# Altium footprint library CPD.PcbLib: 58 footprints (part 3 of 4)
Each footprint in its own frame and in the unit in brackets; x right, y up, seen from the top. Pads: shape width x height; smd on the part's side, far side on the other; paste and mask are expansions set on the pad; w line width, h text height; cw(c..) or ccw(c..) is an arc to the next point about the centre after c.
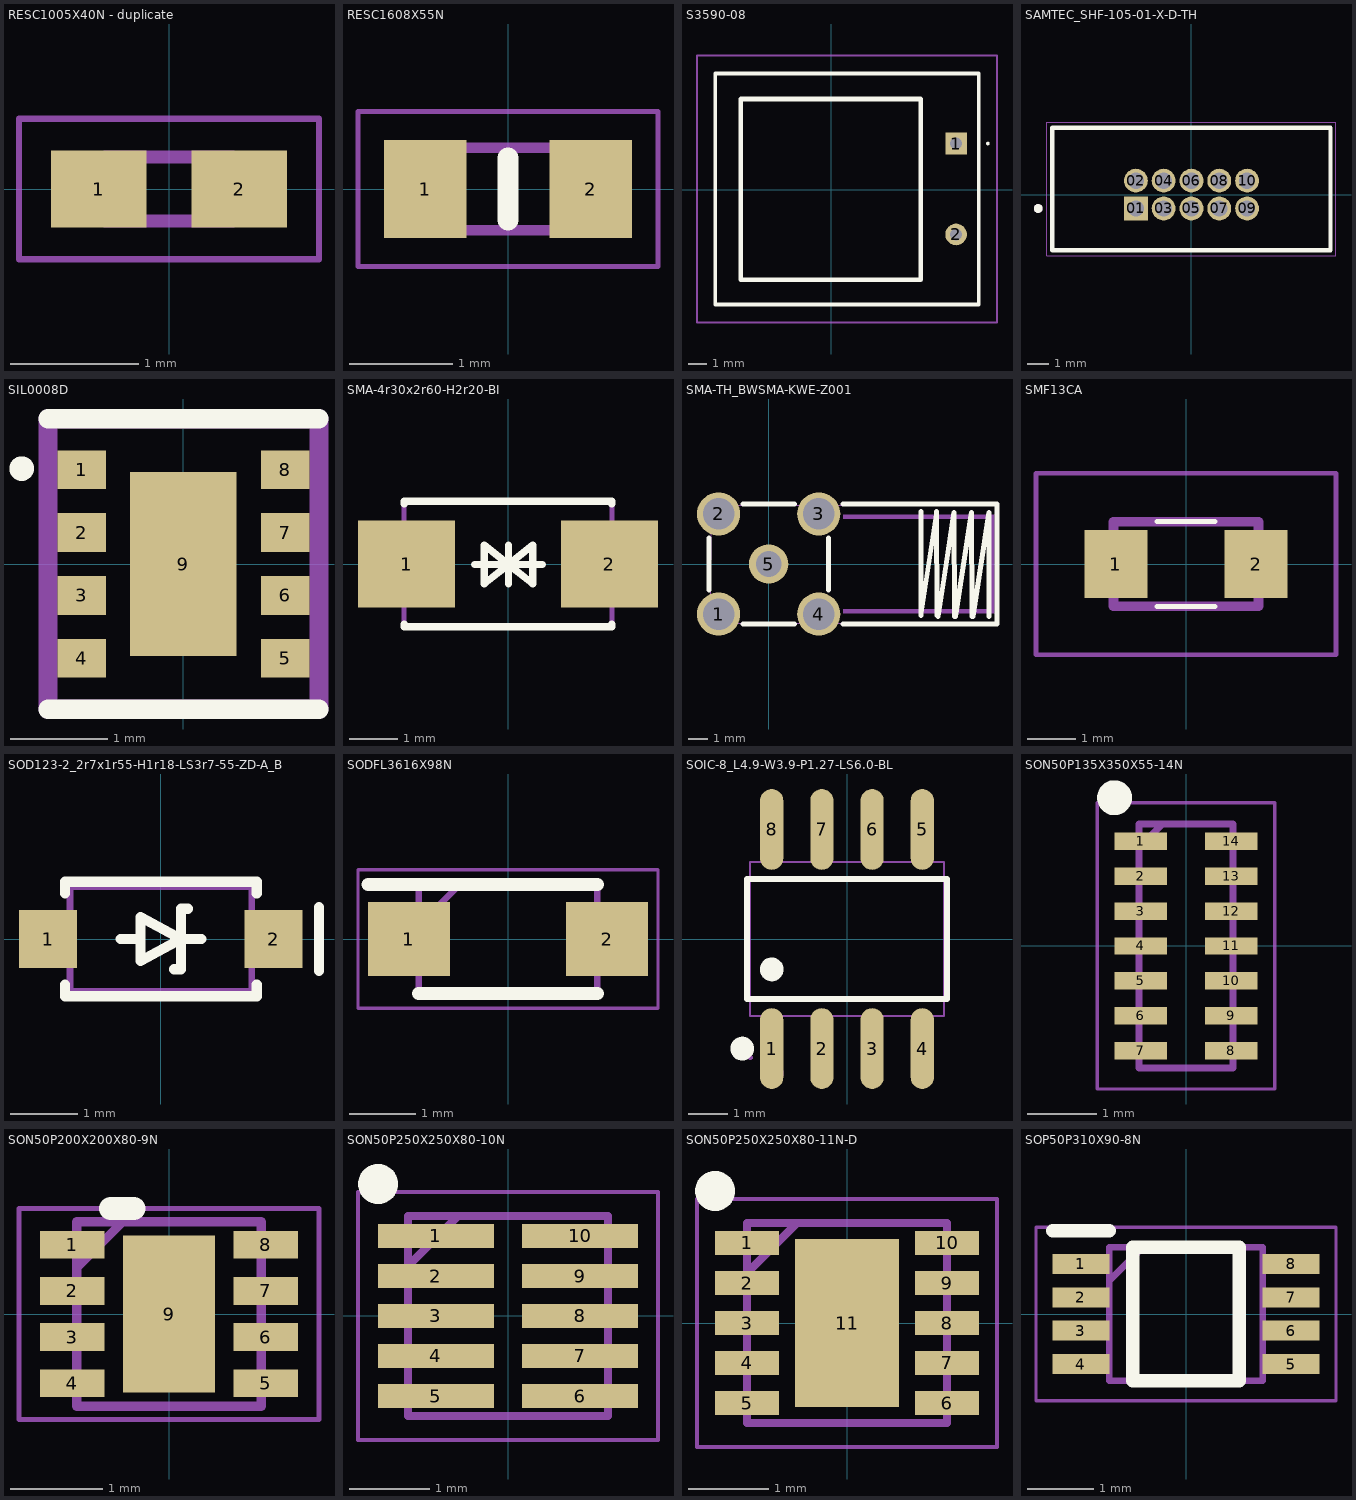
[diagram p2: the footprints below, top view; thin cyan lines are the x and y axes]

## RESC1005X40N - duplicate [mm]
pads (2):
  rect 0.75x0.6 smd: 1(-0.55,0) 2(0.55,0)
Mechanical 13:
  lines w0.1: -0.5,-0.25 -0.5,0.25 0.5,0.25 0.5,-0.25 -0.5,-0.25
Mechanical 15:
  lines w0.05: -1.175,-0.55 -1.175,0.55 1.175,0.55 1.175,-0.55 -1.175,-0.55
3D body "RC0402FR-070RL.stp": height 0.4, standoff 0, extent -0.5,-0.25 0.5,0.25

## RESC1608X55N [mm]
pads (2):
  rect 0.8x0.95 smd: 1(-0.8,0) 2(0.8,0)
Top Overlay:
  lines w0.2: 0,-0.3 0,0.3
Mechanical 13:
  lines w0.1: -0.8,-0.4 0.8,-0.4 0.8,0.4 -0.8,0.4 -0.8,-0.4
Mechanical 15:
  lines w0.05: -1.45,-0.75 1.45,-0.75 1.45,0.75 -1.45,0.75 -1.45,-0.75
3D body "RT0603BRD07523KL.stp": height 0.55, standoff 0, extent -0.8,-0.4 0.8,0.4

## S3590-08 [mm]
pads (2):
  rect 1.192x1.192 hole 0.65: 1(6.858,2.54)
  round 1.192 hole 0.65: 2(6.858,-2.46)
Top Overlay:
  lines w0.1: 8.558,2.54 cw(c8.608,2.54) 8.658,2.54 cw(c8.608,2.54) 8.558,2.54
  lines w0.2: -6.392,-6.31 8.108,-6.31 8.108,6.39 -6.392,6.39 -6.392,-6.31
  lines w0.254: -4.992,-4.96 4.908,-4.96 ; -4.992,-4.91 -4.992,4.99 4.908,4.99 4.908,-4.91
Mechanical 13:
  lines w0.1: -6.392,-6.31 8.108,-6.31 8.108,6.39 -6.392,6.39 -6.392,-6.31
Mechanical 15:
  lines w0.1: -7.392,-7.31 9.108,-7.31 9.108,7.39 -7.392,7.39 -7.392,-7.31
3D body "S3590-08.stp": height 2.08, standoff -5, extent -6.392,-6.31 8.108,6.39

## SAMTEC_SHF-105-01-X-D-TH [mm]
height 5.33
pads (10):
  rect 1.09x1.09 / inner round 1.09 / far side rect 1.09x1.09 hole 0.74: 01(-2.54,-0.635)
  round 1.09 hole 0.74: 02(-2.54,0.635) 03(-1.27,-0.635) 04(-1.27,0.635) 05(0,-0.635) 06(0,0.635) 07(1.27,-0.635) 08(1.27,0.635) 09(2.54,-0.635) 10(2.54,0.635)
Top Overlay:
  circle w0.2: c-7,-0.635 r0.1
  lines w0.2: -6.35,-2.54 -6.35,3.05 6.35,3.05 6.35,-2.54 -6.35,-2.54
Mechanical 13:
  circle w0.2: c-7,-0.635 r0.1
  lines w0.1: -6.35,-2.54 6.35,-2.54 6.35,3.05 -6.35,3.05 -6.35,-2.54
Mechanical 15:
  lines w0.05: -6.6,-2.79 -6.6,3.3 6.6,3.3 6.6,-2.79 -6.6,-2.79
3D body "SHF-105-01-L-D-TH-TR.stp": height 5.36, standoff -1.88, extent -6.35,-2.54 6.35,3.048

## SIL0008D [mm]
pads (9):
  rect 0.5x0.4 smd: 1(-1.05,0.975) 2(-1.05,0.325) 3(-1.05,-0.325) 4(-1.05,-0.975) 5(1.05,-0.975) 6(1.05,-0.325) 7(1.05,0.325) 8(1.05,0.975)
  rect 1.1x1.9 smd: 9(0,0)
Top Overlay:
  circle w0.2: c-1.672,0.986 r0.027
  lines w0.2: -1.4,-1.5 1.4,-1.5 ; -1.4,1.5 1.4,1.5
Mechanical 13:
  lines w0.2: -1.4,-1.5 -1.4,1.5 1.4,1.5 1.4,-1.5 -1.4,-1.5
3D body "TPS82130SILR.stp": height 1.31, standoff 0, extent -1.4,-1.5 1.4,1.5

## SMA-4r30x2r60-H2r20-BI [mm]
height 2.2
pads (2):
  rect 2.007x1.803 smd paste+0 mask+0.076: 1(-2.1,0) 2(2.1,0)
Top Overlay:
  lines w0.152: -2.15,-1.25 -2.15,-1.3 2.15,-1.3 2.15,-1.25 ; -2.15,1.25 -2.15,1.3 2.15,1.3 2.15,1.25 ; -0.69,-0.01 0.71,-0.01 ; 0.01,-0.41 0.01,0.39 ; 0.01,-0.01 -0.49,0.39 -0.49,-0.41 0.01,-0.01 ; 0.01,-0.01 0.51,0.39 0.51,-0.41 0.01,-0.01
Mechanical 13:
  lines w0.1: -0.69,-0.01 0.71,-0.01 ; 0.01,-0.41 0.01,0.39 ; 0.01,-0.01 -0.49,0.39 -0.49,-0.41 0.01,-0.01 ; 0.01,-0.01 0.51,0.39 0.51,-0.41 0.01,-0.01 ; -2.15,-1.3 -2.15,1.3 2.15,1.3 2.15,-1.3 -2.15,-1.3
  text "SMA-4r30x2r60-H2r20-BI" at -5.377,-2.65 h1
3D body "SMA-4r30x2r60-H2r20-BI.step": height 2.19, standoff 0, extent -2.6,-1.27 2.6,1.33

## SMA-TH_BWSMA-KWE-Z001 [mm]
pads (5):
  round 2.2 hole 1.6 paste+0.051: 1(-2.55,-2.55) 2(-2.55,2.55) 3(2.55,2.55)
  round 2.2 hole 1.6 copper offset 0,0 paste+0.051: 4(2.55,-2.55)
  round 2 hole 1.3 paste+0.051: 5(0,0)
Top Overlay:
  lines w0.254: -3.048,-1.316 -3.048,1.316 ; -1.316,-3.048 1.316,-3.048 ; -1.316,3.048 1.316,3.048 ; 3.048,-1.316 3.048,1.316 ; 3.784,-3.048 11.63,-3.048 ; 3.784,3.048 11.6,3.048 ; 7.747,2.667 7.747,-2.633 8.56,2.667 8.566,-2.633 ; 8.636,-2.667 9.449,2.633 9.455,-2.667 ; 9.525,-2.667 10.338,2.633 10.344,-2.667 ; 10.414,-2.667 11.227,2.633 11.233,-2.667 ; 11.63,-3 11.63,-2.62 11.63,2.68 11.63,3.048
Mechanical 2:
  region: 11.5,2.3 11.5,-2.3 11.3,-2.3 11.3,2.3
  region: 3.8,-2.5 11.5,-2.5 11.5,-2.3 3.8,-2.3
  region: 3.8,2.5 11.5,2.5 11.5,2.3 3.8,2.3
Mechanical 6:
  lines w0.051: -2.941,-3.017 -2.941,-2.538 -2.932,2.996 11.591,2.996 11.591,-3.017 -2.941,-3.017
Mechanical 8:
  region: -2.94,-3.017 -2.94,-3.042 -2.975,-3.077 -3.025,-3.077 -3.06,-3.042 -3.06,-3.017 -3.06,-2.992 -3.025,-2.957 -2.975,-2.957 -2.94,-2.992
Mechanical 9:
  region: 2.1,3 3,3 3,2.1 2.1,2.1
  region: 2.1,-2.1 3,-2.1 3,-3 2.1,-3
  region: -3,-2.1 -2.1,-2.1 -2.1,-3 -3,-3
  region: -3,3 -2.1,3 -2.1,2.1 -3,2.1
  region: 0.45,0 0.45,-0.089 0.381,-0.255 0.255,-0.381 0.089,-0.45 -0.09,-0.45 -0.255,-0.381 -0.382,-0.255 -0.45,-0.089 -0.45,0 -0.45,0.09 -0.382,0.255 -0.255,0.382 -0.09,0.45 0.089,0.45 0.255,0.382 0.381,0.255 0.45,0.09

## SMF13CA [mm]
pads (2):
  rect 1.3x1.4 smd: 1(-1.45,0) 2(1.45,0)
Top Overlay:
  lines w0.1: -0.6,-0.875 0.6,-0.875 ; -0.6,0.875 0.6,0.875
Mechanical 13:
  lines w0.2: -1.5,-0.875 1.5,-0.875 1.5,0.875 -1.5,0.875 -1.5,-0.875
Mechanical 15:
  lines w0.1: -3.1,-1.875 3.1,-1.875 3.1,1.875 -3.1,1.875 -3.1,-1.875
3D body "SMF13CA.stp": height 1.18, standoff 0, extent -1.97,-0.875 1.97,0.875

## SOD123-2_2r7x1r55-H1r18-LS3r7-55-ZD-A_B [mm]
height 1.35
pads (2):
  rect 0.864x0.864 smd paste+0 mask+0.076: 1(-1.675,0) 2(1.675,0)
Top Overlay:
  lines w0.152: -1.425,-0.851 -1.425,-0.675 ; -1.425,-0.85 1.425,-0.85 ; -1.425,0.675 -1.425,0.851 ; -1.425,0.85 1.425,0.85 ; -0.6,0 -0.3,0 ; -0.3,-0.326 0.3,0 ; -0.3,-0.325 -0.3,0.325 ; -0.3,0.326 0.3,0 ; 0.2,-0.45 0.3,-0.45 0.3,0.45 0.4,0.45 ; 0.6,0 0.3,0 ; 1.425,-0.851 1.425,-0.675 ; 1.425,0.675 1.425,0.851 ; 2.35,-0.475 2.35,0.475
Mechanical 13:
  lines w0.1: -0.6,0 -0.3,0 ; -0.3,-0.326 0.3,0 ; -0.3,-0.325 -0.3,0.325 ; -0.3,0.326 0.3,0 ; 0.2,-0.45 0.3,-0.45 0.3,0.45 0.4,0.45 ; 0.6,0 0.3,0 ; -1.35,-0.775 1.35,-0.775 1.35,0.775 -1.35,0.775 -1.35,-0.775
3D body "SOD123-2_2r7x1r55-H1r18-LS3r7-55-ZD-A.step": height 1.18, standoff 0, extent -1.85,-0.775 1.85,0.775

## SODFL3616X98N [mm]
pads (2):
  rect 1.24x1.12 smd: 1(-1.5,0) 2(1.5,0)
Top Overlay:
  lines w0.2: -2.12,0.825 1.35,0.825 ; -1.35,-0.825 1.35,-0.825
Mechanical 13:
  lines w0.1: -1.35,0.205 -0.73,0.825 ; -1.35,-0.825 -1.35,0.825 1.35,0.825 1.35,-0.825 -1.35,-0.825
Mechanical 15:
  lines w0.05: -2.27,-1.05 -2.27,1.05 2.27,1.05 2.27,-1.05 -2.27,-1.05
3D body "SMF26AT1G.stp": height 0.98, standoff 0, extent -1.8,-0.825 1.8,0.825

## SOIC-8_L4.9-W3.9-P1.27-LS6.0-BL [mm]
pads (8):
  oval 0.588x2.045 smd paste+0.051: 1(-1.905,-2.772) 2(-0.635,-2.772) 3(0.635,-2.772) 4(1.905,-2.772) 5(1.905,2.772) 6(0.635,2.772) 7(-0.635,2.772) 8(-1.905,2.772)
Top Overlay:
  circle w0.3: c-2.652,-2.772 r0.15
  circle w0.3: c-1.905,-0.769 r0.15
  lines w0.152: -2.526,-1.521 2.526,-1.521 2.526,1.521 -2.526,1.521 -2.526,-1.521
Mechanical 2:
  circle w0.3: c-1.905,-3.4 r0.15
Mechanical 6:
  lines w0.051: -2.45,-1.95 2.45,-1.95 2.45,1.95 -2.45,1.95 -2.45,-1.95
Mechanical 7:
  region: 1.695,2.175 1.695,1.94 2.115,1.94 2.115,2.175
  region: 0.425,2.175 0.425,1.94 0.845,1.94 0.845,2.175
  region: -0.845,2.175 -0.845,1.94 -0.425,1.94 -0.425,2.175
  region: -2.115,2.175 -2.115,1.94 -1.695,1.94 -1.695,2.175
  region: 1.695,-2.175 1.695,-1.94 2.115,-1.94 2.115,-2.175
  region: 0.425,-2.175 0.425,-1.94 0.845,-1.94 0.845,-2.175
  region: -0.845,-2.175 -0.845,-1.94 -0.425,-1.94 -0.425,-2.175
  region: -2.115,-2.175 -2.115,-1.94 -1.695,-1.94 -1.695,-2.175
Mechanical 8:
  region: -2.39,-3 -2.39,-3.025 -2.425,-3.06 -2.475,-3.06 -2.51,-3.025 -2.51,-3 -2.51,-2.975 -2.475,-2.94 -2.425,-2.94 -2.39,-2.975
Mechanical 9:
  region: 1.695,3 1.695,2.165 2.115,2.165 2.115,3
  region: 0.425,3 0.425,2.165 0.845,2.165 0.845,3
  region: -0.845,3 -0.845,2.165 -0.425,2.165 -0.425,3
  region: -2.115,3 -2.115,2.165 -1.695,2.165 -1.695,3
  region: 1.695,-3 1.695,-2.165 2.115,-2.165 2.115,-3
  region: 0.425,-3 0.425,-2.165 0.845,-2.165 0.845,-3
  region: -0.845,-3 -0.845,-2.165 -0.425,-2.165 -0.425,-3
  region: -2.115,-3 -2.115,-2.165 -1.695,-2.165 -1.695,-3
3D body "SOIC-8_L4.9-W3.9.step": height 1.7, standoff 0, extent -2.45,-3 2.45,3

## SON50P135X350X55-14N [mm]
pads (14):
  rect 0.75x0.25 smd: 1(-0.65,1.5) 2(-0.65,1) 3(-0.65,0.5) 4(-0.65,0) 5(-0.65,-0.5) 6(-0.65,-1) 7(-0.65,-1.5) 8(0.65,-1.5) 9(0.65,-1) 10(0.65,-0.5) 11(0.65,0) 12(0.65,0.5) 13(0.65,1) 14(0.65,1.5)
Top Overlay:
  circle w0.25: c-1.025,2.125 r0.125
Mechanical 13:
  lines w0.1: -0.675,1.412 -0.338,1.75 ; -0.675,-1.75 0.675,-1.75 0.675,1.75 -0.675,1.75 -0.675,-1.75
Mechanical 15:
  lines w0.05: -1.275,-2.05 1.275,-2.05 1.275,2.05 -1.275,2.05 -1.275,-2.05
3D body "TPD6E05U06RVZR.stp": height 0.55, standoff 0, extent -0.725,-1.75 0.725,1.75

## SON50P200X200X80-9N [mm]
pads (9):
  rect 0.7x0.3 smd: 1(-1.05,0.75) 2(-1.05,0.25) 3(-1.05,-0.25) 4(-1.05,-0.75) 5(1.05,-0.75) 6(1.05,-0.25) 7(1.05,0.25) 8(1.05,0.75)
  rect 1x1.7 smd: 9(0,0)
Top Overlay:
  lines w0.254: -0.631,1.143 -0.381,1.143
Mechanical 13:
  lines w0.1: -1,0.5 -0.5,1 ; -1,-1 -1,1 1,1 1,-1 -1,-1
Mechanical 15:
  lines w0.05: -1.625,-1.143 -1.625,-0.572 -1.625,0.572 -1.625,1.143 -1.265,1.143 -1.173,1.143 -0.656,1.143 0.656,1.143 1.173,1.143 1.265,1.143 1.625,1.143 1.625,-1.143 0.97,-1.143 0.249,-1.143 -0.249,-1.143 -0.656,-1.143 -1.173,-1.143 -1.265,-1.143 -1.625,-1.143
3D body "JFE2140DSGR.stp": height 0.8, standoff 0, extent -1.05,-1 1.05,1

## SON50P250X250X80-10N [mm]
pads (10):
  rect 1.45x0.3 smd: 1(-0.9,1) 2(-0.9,0.5) 3(-0.9,0) 4(-0.9,-0.5) 5(-0.9,-1) 6(0.9,-1) 7(0.9,-0.5) 8(0.9,0) 9(0.9,0.5) 10(0.9,1)
Top Overlay:
  circle w0.25: c-1.625,1.65 r0.125
Mechanical 13:
  lines w0.1: -1.25,0.625 -0.625,1.25 ; -1.25,-1.25 -1.25,1.25 1.25,1.25 1.25,-1.25 -1.25,-1.25
Mechanical 15:
  lines w0.05: -1.875,-1.55 -1.875,1.55 1.875,1.55 1.875,-1.55 -1.875,-1.55
3D body "DAC70502DRXR.stp": height 0.48, standoff 0, extent -1.25,-1.25 1.25,1.25

## SON50P250X250X80-11N-D [mm]
pads (11):
  rect 0.8x0.3 smd: 1(-1.25,1) 2(-1.25,0.5) 3(-1.25,0) 4(-1.25,-0.5) 5(-1.25,-1) 6(1.25,-1) 7(1.25,-0.5) 8(1.25,0) 9(1.25,0.5) 10(1.25,1)
  rect 1.3x2.1 smd: 11(0,0)
Top Overlay:
  circle w0.25: c-1.65,1.65 r0.125
Mechanical 13:
  lines w0.1: -1.25,0.625 -0.625,1.25 ; -1.25,-1.25 -1.25,1.25 1.25,1.25 1.25,-1.25 -1.25,-1.25
Mechanical 15:
  lines w0.05: -1.875,-1.55 -1.875,1.55 1.875,1.55 1.875,-1.55 -1.875,-1.55
3D body "TPS7A9001DSKR.stp": height 0.77, standoff 0, extent -1.25,-1.25 1.25,1.25

## SOP50P310X90-8N [mm]
pads (8):
  rect 0.85x0.3 smd: 1(-1.575,0.75) 2(-1.575,0.25) 3(-1.575,-0.25) 4(-1.575,-0.75) 5(1.575,-0.75) 6(1.575,-0.25) 7(1.575,0.25) 8(1.575,0.75)
Top Overlay:
  lines w0.2: -2,1.25 -1.15,1.25 ; -0.8,-1 0.8,-1 0.8,1 -0.8,1 -0.8,-1
Mechanical 13:
  lines w0.1: -1.15,0.5 -0.65,1 ; -1.15,-1 1.15,-1 1.15,1 -1.15,1 -1.15,-1
Mechanical 15:
  lines w0.05: -2.25,-1.3 2.25,-1.3 2.25,1.3 -2.25,1.3 -2.25,-1.3
3D body "PCA9306DCUTG4.stp": height 0.77, standoff 0, extent -1.55,-1 1.55,1